# Altium footprint library 1.03-电容.PcbLib: 224 footprints (part 2 of 14)
Each footprint in its own frame and in the unit in brackets; x right, y up, seen from the top. Pads: shape width x height; smd on the part's side, far side on the other; paste and mask are expansions set on the pad; w line width, h text height; cw(c..) or ccw(c..) is an arc to the next point about the centre after c.
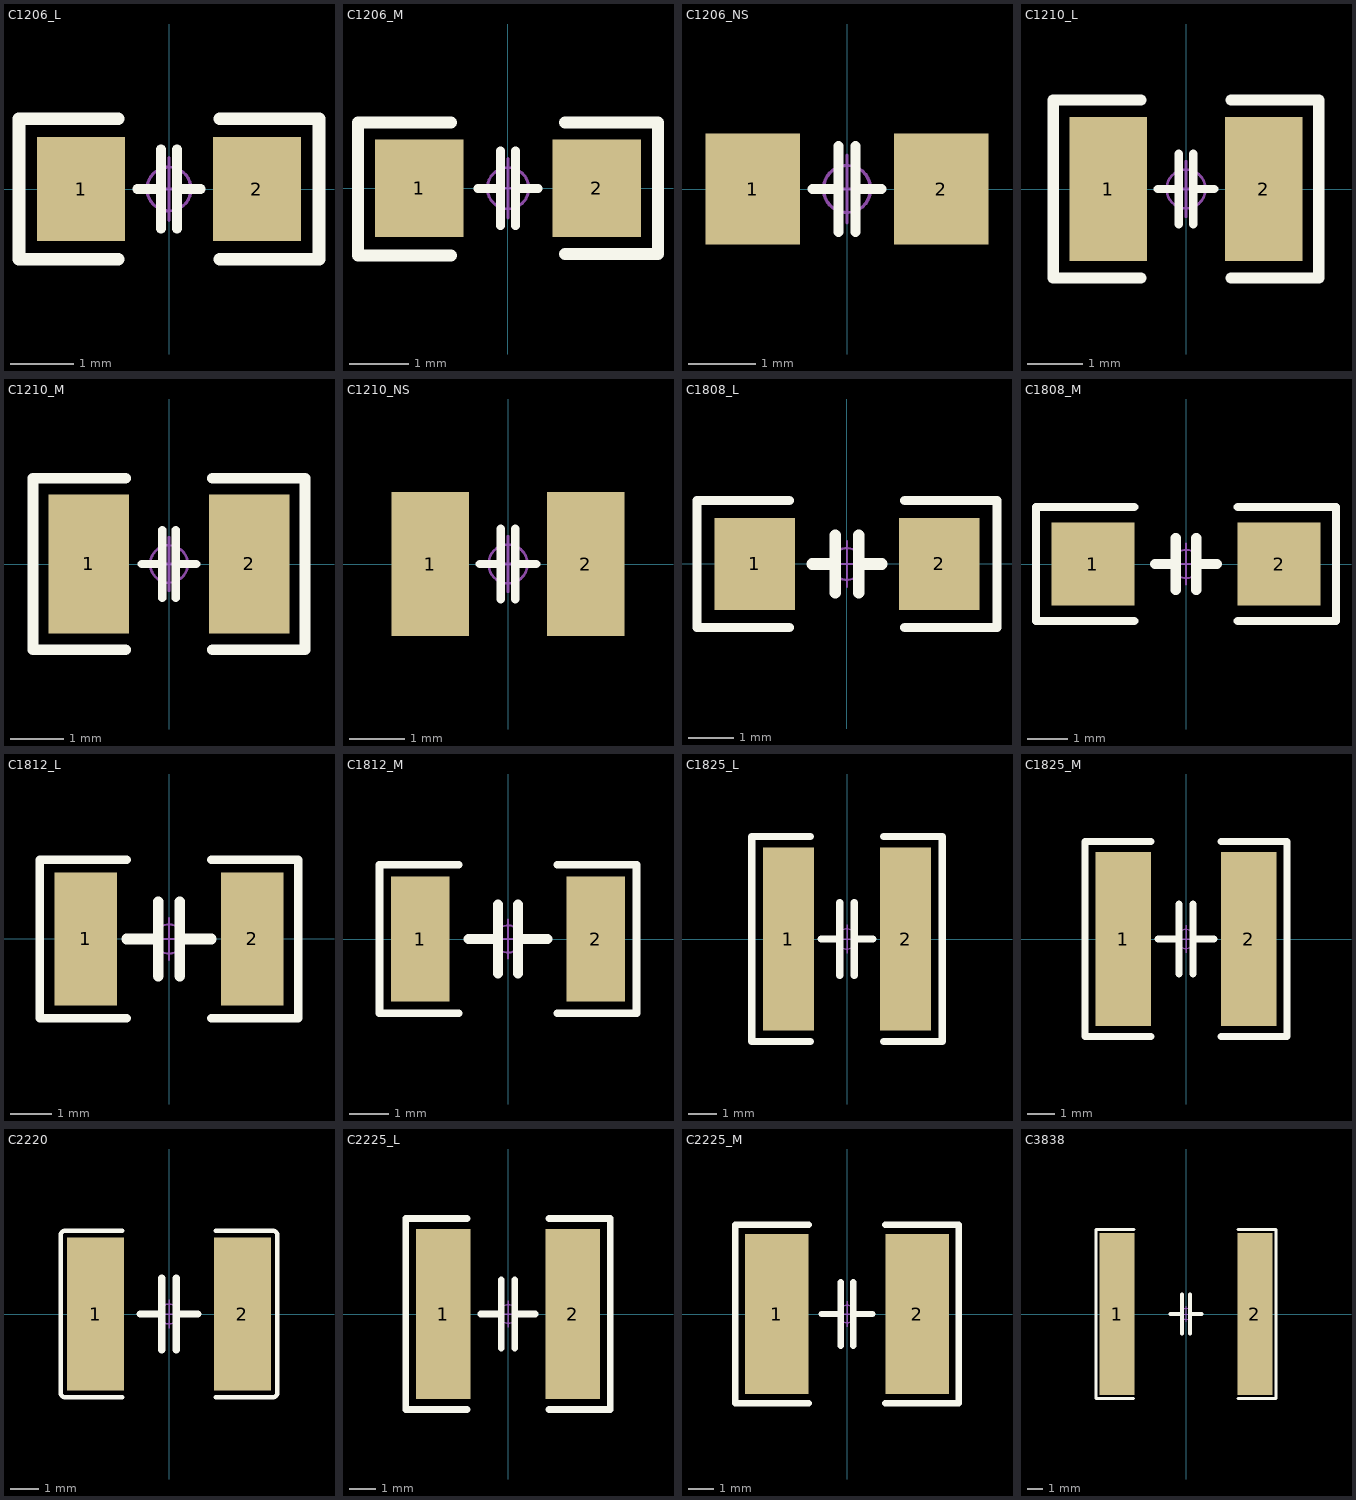
[diagram p1: the footprints below, top view; thin cyan lines are the x and y axes]

## C1206_L [mm] "贴片MLCC电容"
pads (2):
  rect 1.4x1.65 smd: 1(-1.4,0) 2(1.4,0)
Top Overlay:
  lines w0.152: -0.508,0 -0.127,0 ; -0.127,-0.635 -0.127,0.635 ; 0.127,-0.635 0.127,0.635 ; 0.127,0 0.508,0
  lines w0.203: -0.813,-1.118 -2.388,-1.118 -2.388,1.118 -0.813,1.118 ; 0.813,-1.118 2.388,-1.118 2.388,1.118 0.813,1.118
Mechanical 15:
  circle w0.05: c0,0 r0.35
  lines w0.05: -0.5,0 0.5,0 ; 0,-0.5 0,0.5
3D body "C1206-2S.stp": height 1.1, standoff 0, extent -1.6,-0.798 1.6,0.798

## C1206_M [mm] "贴片MLCC电容"
pads (2):
  rect 1.5x1.65 smd: 1(-1.5,0) 2(1.5,0)
Top Overlay:
  lines w0.152: -0.508,0 -0.127,0 ; -0.127,-0.635 -0.127,0.635 ; 0.127,-0.635 0.127,0.635 ; 0.127,0 0.508,0
  lines w0.203: -2.54,-1.143 -0.965,-1.143 ; -2.54,-1.118 -2.54,1.118 -0.965,1.118 ; 0.965,-1.118 2.54,-1.118 2.54,1.118 0.965,1.118
Mechanical 15:
  circle w0.05: c0,0 r0.35
  lines w0.05: -0.5,0 0.5,0 ; 0,-0.5 0,0.5
3D body "C1206-2S.stp": height 1.1, standoff 0, extent -1.6,-0.798 1.6,0.798

## C1206_NS [mm] "贴片MLCC电容-无丝印                           淘宝ID:黄晶宝石"
pads (2):
  rect 1.4x1.65 smd: 1(-1.4,0) 2(1.4,0)
Top Overlay:
  lines w0.152: -0.508,0 -0.127,0 ; -0.127,-0.635 -0.127,0.635 ; 0.127,-0.635 0.127,0.635 ; 0.127,0 0.508,0
Mechanical 15:
  circle w0.05: c0,0 r0.35
  lines w0.05: -0.5,0 0.5,0 ; 0,-0.5 0,0.5
3D body "C1206-2S.stp": height 1.1, standoff 0, extent -1.6,-0.798 1.6,0.798

## C1210_L [mm] "贴片MLCC电容             联系卖家 免费查找封装"
pads (2):
  rect 1.4x2.6 smd: 1(-1.4,0) 2(1.4,0)
Top Overlay:
  lines w0.152: -0.508,0 -0.127,0 ; -0.127,-0.635 -0.127,0.635 ; 0.127,-0.635 0.127,0.635 ; 0.127,0 0.508,0
  lines w0.203: -0.813,-1.6 -2.388,-1.6 -2.388,1.6 -0.813,1.6 ; 0.813,-1.6 2.388,-1.6 2.388,1.6 0.813,1.6
Mechanical 15:
  circle w0.05: c0,0 r0.35
  lines w0.05: -0.5,0 0.5,0 ; 0,-0.5 0,0.5
3D body "C1210-2S.stp": height 0.92, standoff 0.02, extent -1.6,-1.26 1.6,1.26

## C1210_M [mm] "贴片MLCC电容"
pads (2):
  rect 1.5x2.6 smd: 1(-1.5,0) 2(1.5,0)
Top Overlay:
  lines w0.152: -0.508,0 -0.127,0 ; -0.127,-0.635 -0.127,0.635 ; 0.127,-0.635 0.127,0.635 ; 0.127,0 0.508,0
  lines w0.203: -0.813,-1.6 -2.54,-1.6 -2.54,1.6 -0.813,1.6 ; 0.813,-1.6 2.54,-1.6 2.54,1.6 0.813,1.6
Mechanical 15:
  circle w0.05: c0,0 r0.35
  lines w0.05: -0.5,0 0.5,0 ; 0,-0.5 0,0.5
3D body "C1210-2S.stp": height 0.92, standoff 0.02, extent -1.6,-1.26 1.6,1.26

## C1210_NS [mm] "贴片MLCC电容 -无丝印"
pads (2):
  rect 1.4x2.6 smd: 1(-1.4,0) 2(1.4,0)
Top Overlay:
  lines w0.152: -0.508,0 -0.127,0 ; -0.127,-0.635 -0.127,0.635 ; 0.127,-0.635 0.127,0.635 ; 0.127,0 0.508,0
Mechanical 15:
  circle w0.05: c0,0 r0.35
  lines w0.05: -0.5,0 0.5,0 ; 0,-0.5 0,0.5
3D body "C1210-2S.stp": height 0.92, standoff 0.02, extent -1.6,-1.26 1.6,1.26

## C1808_L [mil] "贴片MLCC电容                 联系卖家 免费查找封装"
pads (2):
  rect 70x80 smd: 1(-80,0) 2(80,0)
Top Overlay:
  lines w8: -50,-55 -130,-55 -130,55 -50,55 ; 50,-55 130,-55 130,55 50,55
  lines w10: -30,0 -10,0 ; -10,-25 -10,25 ; 10,-25 10,25 ; 10,0 30,0
Mechanical 15:
  circle w1.97: c0,0 r13.78
  lines w1.97: -19.68,0 19.68,0 ; 0,-19.68 0,19.68
3D body "C1808H20-2S.stp": height 80.7, standoff 1.92, extent -88.53,-39.34 88.54,39.36

## C1808_M [mil] "贴片MLCC电容                联系卖家 免费查找封装"
pads (2):
  rect 80x80 smd: 1(-90,0) 2(90,0)
Top Overlay:
  lines w8: -50,-55 -145,-55 -145,55 -50,55 ; 50,-55 145,-55 145,55 50,55
  lines w10: -30,0 -10,0 ; -10,-25 -10,25 ; 10,-25 10,25 ; 10,0 30,0
Mechanical 15:
  circle w1.97: c0,0 r13.78
  lines w1.97: -19.68,0 19.68,0 ; 0,-19.68 0,19.68
3D body "C1808H20-2S.stp": height 80.7, standoff 1.92, extent -88.53,-39.34 88.54,39.36

## C1812_L [mm] "贴片MLCC电容                  联系卖家 免费查找封装"
pads (2):
  rect 1.5x3.2 smd: 1(-2,0) 2(2,0)
Top Overlay:
  lines w0.203: -1.016,-1.905 -3.1,-1.905 -3.1,1.905 -1.016,1.905 ; 1.016,-1.905 3.1,-1.905 3.1,1.905 1.016,1.905
  lines w0.254: -1.016,0 -0.254,0 ; -0.254,-0.889 -0.254,0.889 ; 0.254,-0.889 0.254,0.889 ; 0.254,0 1.016,0
Mechanical 15:
  circle w0.05: c0,0 r0.35
  lines w0.05: -0.5,0 0.5,0 ; 0,-0.5 0,0.5
3D body "C1812H26-2S.stp": height 2.6, standoff 0, extent -2.25,-1.6 2.25,1.6

## C1812_M [mm] "贴片MLCC电容                  联系卖家 免费查找封装"
pads (2):
  rect 1.5x3.2 smd: 1(-2.25,0) 2(2.25,0)
Top Overlay:
  lines w0.203: -1.27,-1.905 -3.302,-1.905 -3.302,1.905 -1.27,1.905 ; 1.27,-1.905 3.302,-1.905 3.302,-0.508 3.302,1.905 1.27,1.905
  lines w0.254: -1.016,0 -0.254,0 ; -0.254,-0.889 -0.254,0.889 ; 0.254,-0.889 0.254,0.889 ; 0.254,0 1.016,0
Mechanical 15:
  circle w0.05: c0,0 r0.35
  lines w0.05: -0.5,0 0.5,0 ; 0,-0.5 0,0.5
3D body "C1812H26-2S.stp": height 2.6, standoff 0, extent -2.25,-1.6 2.25,1.6

## C1825_L [mil] "贴片MLCC电容                联系卖家 免费查找封装"
pads (2):
  rect 70x250 smd: 1(-80,0) 2(80,0)
Top Overlay:
  lines w10: -50,-140 -130,-140 -130,140 -50,140 ; -35,0 -10,0 ; -10,-50 -10,50 ; 10,-50 10,50 ; 10,0 35,0 ; 50,-140 130,-140 130,140 50,140
Mechanical 15:
  circle w1.97: c0,0 r13.78
  lines w1.97: -19.68,0 19.68,0 ; 0,-19.68 0,19.68
3D body "C1825H11-2S.stp": height 43.31, standoff -0.08, extent -88.58,-125.98 88.59,125.99

## C1825_M [mil] "贴片MLCC电容                            联系卖家 免费查找封装"
pads (2):
  rect 80x250 smd: 1(-90,0) 2(90,0)
Top Overlay:
  lines w10: -50,-140 -145,-140 -145,140 -50,140 ; -40,0 -10,0 ; -10,-50 -10,50 ; 10,-50 10,50 ; 10,0 40,0 ; 50,-140 145,-140 145,140 50,140
Mechanical 15:
  circle w1.97: c0,0 r13.78
  lines w1.97: -19.68,0 19.68,0 ; 0,-19.68 0,19.68
3D body "C1825H11-2S.stp": height 43.31, standoff -0.08, extent -88.58,-125.98 88.59,125.99

## C2220 [mm] "贴片MLCC电容                                          淘宝ID:黄晶宝石"
pads (2):
  rect 2.009x5.4 smd mask+0.051: 1(-2.581,0) 2(2.581,0)
Top Overlay:
  lines w0.152: -3.814,-2.776 ccw(c-3.661,-2.776) -3.661,-2.929 ; -3.814,2.776 cw(c-3.661,2.776) -3.661,2.929 ; -3.813,-2.776 -3.813,2.776 ; -3.66,-2.929 -1.651,-2.929 ; -3.66,2.929 -1.651,2.929 ; 1.651,-2.929 3.66,-2.929 ; 1.651,2.929 3.66,2.929 ; 3.661,-2.929 ccw(c3.661,-2.776) 3.814,-2.776 ; 3.661,2.929 cw(c3.661,2.776) 3.814,2.776 ; 3.813,-2.776 3.813,2.776
  lines w0.254: -1.016,0 -0.254,0 ; -0.254,-1.27 -0.254,1.27 ; 0.254,-1.27 0.254,1.27 ; 0.254,0 1.016,0
Top Paste:
  region: -1.575,-2.601 -1.575,-1.019 -1.674,-0.917 -2.159,-0.917 -2.258,-0.818 -2.258,0.818 -2.159,0.917 -1.674,0.917 -1.575,1.019 -1.575,2.601 -1.674,2.7 -3.485,2.7 -3.584,2.601 -3.584,-2.601 -3.485,-2.7 -1.674,-2.7
  region: 1.575,-2.601 1.575,-1.019 1.674,-0.917 2.159,-0.917 2.258,-0.818 2.258,0.818 2.159,0.917 1.674,0.917 1.575,1.019 1.575,2.601 1.674,2.7 3.485,2.7 3.584,2.601 3.584,-2.601 3.485,-2.7 1.674,-2.7
Mechanical 15:
  circle w0.05: c0,0 r0.35
  lines w0.05: -0.5,0 0.5,0 ; 0,-0.5 0,0.5
3D body "C2220H25-2S.stp": height 2.5, standoff 0, extent -2.85,-2.5 2.85,2.5

## C2225_L [mil] "贴片MLCC电容                 联系卖家 免费查找封装"
pads (2):
  rect 80x250 smd: 1(-95,0) 2(95,0)
Top Overlay:
  lines w10: -60,-140 -150,-140 -150,140 -60,140 ; -40,0 -10,0 ; -10,-50 -10,50 ; 10,-50 10,50 ; 10,0 40,0 ; 60,-140 150,-140 150,140 60,140
Mechanical 15:
  circle w1.97: c0,0 r13.78
  lines w1.97: -19.68,0 19.68,0 ; 0,-19.68 0,19.68
3D body "C 2225.STEP": height 65.39, standoff 1.61, extent -110.24,-125.4 110.24,125.39

## C2225_M [mil] "贴片MLCC电容                 联系卖家 免费查找封装"
pads (2):
  rect 100x250 smd: 1(-110,0) 2(110,0)
Top Overlay:
  lines w10: -60,-140 -175,-140 -175,140 -60,140 ; -40,0 -10,0 ; -10,-50 -10,50 ; 10,-50 10,50 ; 10,0 40,0 ; 60,-140 175,-140 175,140 60,140
Mechanical 15:
  circle w1.97: c0,0 r13.78
  lines w1.97: -19.68,0 19.68,0 ; 0,-19.68 0,19.68
3D body "C 2225.STEP": height 65.39, standoff 1.61, extent -110.24,-125.39 110.24,125.4

## C3838 [mm] "贴片MLCC电容-无丝印"
pads (2):
  rect 2.266x10.475 smd mask+0.051: 1(-4.453,0) 2(4.453,0)
Top Overlay:
  lines w0.203: -3.404,-5.466 -5.814,-5.466 -5.814,5.466 -3.378,5.466 ; 3.353,5.466 5.814,5.466 5.814,-5.466 ; 3.378,-5.466 5.817,-5.466
  lines w0.254: -1.016,0 -0.254,0 ; -0.254,-1.27 -0.254,1.27 ; 0.254,-1.27 0.254,1.27 ; 0.254,0 1.016,0
Mechanical 15:
  circle w0.05: c0,0 r0.35
  lines w0.05: -0.5,0 0.5,0 ; 0,-0.5 0,0.5
3D body "C3838H43-2S.stp": height 4.32, standoff 0, extent -4.835,-4.835 4.835,4.835